# Altium schematic symbol library altera-stratix-iv.SCHLIB: 38 symbols (part 15 of 21) (continued)
## EP4SGX290KF43 (continued)

## EP4SGX360FF35
designator IC?, comment EP4SGX360FF35   Auto generated by make-symbol-device-package-bsdl.ulp Rev. 29 Source: EP4SGX360FF35.bsd
MPN: EP4SGX360FF35C3N
footprint FBGA1152
pins: A2 IOA2, A3 IOA3, A4 IOA4, A5 IOA5, A6 IOA6, A7 IOA7, A8 IOA8, A9 IOA9, A10 IOA10, A11 IOA11, A12 IOA12, A13 IOA13, A14 IOA14, A15 IOA15, A16 IOA16, A17 IOA17, A18 IOA18, A19 IOA19, A20 IOA20, A21 IOA21, A22 IOA22, A23 IOA23, A24 IOA24, A25 IOA25, A26 IOA26, A27 IOA27, A28 IOA28, A29 IOA29, A30 IOA30, A31 IOA31, A32 IOA32, A33 IOA33, AA1 GXB_RX_R5N, AA2 GXB_RX_R5P, AA3 GND@224 (power), AA4 GND@223 (power), AA5 VCC@169 (power), AA6 GND@222 (power), AA7 VCC@156 (power), AA8 GND@221 (power), AA9 VCC@162 (power), AA10 IOAA10, AA11 IOAA11, AA12 IOAA12, AA13 VCC@77 (power), AA14 GND@40 (power), AA15 VCC@78 (power), AA16 GND@41 (power), AA17 VCC@79 (power), AA18 GND@42 (power), AA19 VCC@80 (power), AA20 GND@43 (power), AA21 VCC@81 (power), AA22 GND@44 (power), AA23 IOAA23, AA24 GND@45 (power), AA25 IOAA25, AA26 VCC@159 (power), AA27 GND@165 (power), AA28 VCC@154 (power), AA29 GND@164 (power), AA30 VCC@167 (power), AA31 GND@163 (power), AA32 GND@162 (power), AA33 GXB_RX_L5P, AA34 GXB_RX_L5N, AB1 GND@228 (power), AB2 GND@227 (power), AB3 GXB_TX_R5N, AB4 GXB_TX_R5P, AB5 GND@226 (power), AB6 VCC@172 (power), AB7 GND@225 (power), AB8 VCC@184 (power), AB9 VCC@185 (power), AB10 IOAB10, AB11 IOAB11, AB12 IOAB12, AB13 GND@35 (power), AB14 VCC@72 (power), AB15 GND@36 (power), AB16 VCC@73 (power), AB17 GND@37 (power), AB18 VCC@74 (power), AB19 GND@38 (power), AB20 VCC@75 (power), AB21 GND@39 (power), AB22 VCC@76 (power), AB23 IOAB23, AB24 IOAB24, AB25 IOAB25, AB26 VCC@180 (power), AB27 VCC@181 (power), AB28 GND@169 (power), AB29 VCC@171 (power), AB30 GND@168 (power), AB31 GXB_TX_L5P, AB32 GXB_TX_L5N, AB33 GND@167 (power), AB34 GND@166 (power), AC1 GXB_RX_R4N, AC2 GXB_RX_R4P, AC3 GND@230 (power), AC4 GND@229 (power), AC5 GXB_CMURX_R3N, AC6 GXB_CMURX_R3P, AC7 NC21, AC8 GND@1 (power), AC9 GND@33 (power), AC10 IOAC10, AC11 GND@34 (power), AC12 IOAC12, AC13 VCC@128 (power), AC14 IOAC14, AC15 VCC@127 (power), AC16 IOAC16, AC17 VCC@126 (power), AC18 IOAC18, AC19 VCC@125 (power), AC20 IOAC20, AC21 VCC@124 (power), AC22 IOAC22, AC23 VCC@123 (power), AC24 IOAC24, AC25 IOAC25, AC26 IOAC26, AC27 NCONFIG, AC28 NC22, AC29 GXB_CMURX_L3P, AC30 GXB_CMURX_L3N, AC31 GND@171 (power), AC32 GND@170 (power), AC33 GXB_RX_L4P, AC34 GXB_RX_L4N, AD1 GND@234 (power), AD2 GND@233 (power), AD3 GXB_TX_R4N, AD4 GXB_TX_R4P, AD5 GND@232 (power), AD6 GND@231 (power), AD7 NC19, AD8 NCSO, AD9 IOAD9, AD10 VCC@148 (power), AD11 IOAD11, AD12 GND@27 (power), AD13 IOAD13, AD14 IOAD14, AD15 GND@28 (power), AD16 IOAD16, AD17 IOAD17, AD18 GND@29 (power), AD19 IOAD19, AD20 IOAD20, AD21 GND@30 (power), AD22 IOAD22, AD23 IOAD23, AD24 GND@31 (power), AD25 VCC@147 (power), AD26 IOAD26, AD27 GND@32 (power), AD28 NC20, AD29 GND@175 (power), AD30 GND@174 (power), AD31 GXB_TX_L4P, AD32 GXB_TX_L4N, AD33 GND@173 (power), AD34 GND@172 (power), AE1 GXB_RX_R3N, AE2 GXB_RX_R3P, AE3 GND@236 (power), AE4 GND@235 (power), AE5 GXB_CMURX_R2N, AE6 GXB_CMURX_R2P, AE7 NC17, AE8 NCEO, AE9 IOAE9, AE10 IOAE10, AE11 IOAE11, AE12 IOAE12, AE13 IOAE13, AE14 IOAE14, AE15 IOAE15, AE16 IOAE16, AE17 VCC@8 (power), AE18 IOAE18, AE19 IOAE19, AE20 IOAE20, AE21 IOAE21, AE22 IOAE22, AE23 VCC@29 (power), AE24 IOAE24, AE25 IOAE25, AE26 IOAE26, AE27 IOAE27, AE28 NC18, AE29 GXB_CMURX_L2P, AE30 GXB_CMURX_L2N, AE31 GND@177 (power), AE32 GND@176 (power), AE33 GXB_RX_L3P, AE34 GXB_RX_L3N, AF1 GND@240 (power), AF2 GND@239 (power), AF3 GXB_TX_R3N, AF4 GXB_TX_R3P, AF5 GND@238 (power), AF6 GND@237 (power), AF7 NC15, AF8 GND@26 (power), AF9 VCC@42 (power), AF11 VCC@43 (power), AF12 IOAF12, AF14 IOAF14, AF16 IOAF16, AF17 VCC@141 (power), AF18 VCC@3 (power), AF19 IOAF19, AF21 IOAF21, AF23 IOAF23, AF24 IOAF24, AF25 VCC@28 (power), AF27 VCC@140 (power), AF28 NC16, AF29 GND@181 (power), AF30 GND@180 (power), AF31 GXB_TX_L3P, AF32 GXB_TX_L3N, AF33 GND@179 (power), AF34 GND@178 (power), AG1 GXB_RX_R2N, AG2 GXB_RX_R2P, AG3 GND@242 (power), AG4 GND@241 (power), AG5 GXB_CMURX_R1N, AG6 GXB_CMURX_R1P, AG7 NC13, AG8 VCC@142 (power), AG9 GND@19 (power), AG10 IOAG10, AG11 IOAG11, AG12 GND@20 (power), AG13 IOAG13, AG14 IOAG14, AG15 GND@21 (power), AG16 IOAG16, AG17 VCC@6 (power), AG18 GND@22 (power), AG19 IOAG19, AG20 IOAG20, AG21 GND@23 (power), AG22 IOAG22, AG23 IOAG23, AG24 GND@24 (power), AG25 IOAG25, AG26 IOAG26, AG27 GND@25 (power), AG28 NC14, AG29 GXB_CMURX_L1P, AG30 GXB_CMURX_L1N, AG31 GND@201 (power), AG32 GND@182 (power), AG33 GXB_RX_L2P, AG34 GXB_RX_L2N, AH1 GND@246 (power), AH2 GND@245 (power), AH3 GXB_TX_R2N, AH4 GXB_TX_R2P, AH5 GND@244 (power), AH6 GND@243 (power), AH7 NC11, AH8 IOAH8, AH9 IOAH9, AH10 VCC@41 (power), AH11 IOAH11, AH12 IOAH12, AH13 IOAH13, AH14 VCC@37 (power), AH15 IOAH15, AH16 IOAH16, AH17 VCC@7 (power), AH18 VCC@5 (power), AH19 IOAH19, AH20 VCC@34 (power), AH21 IOAH21, AH22 IOAH22, AH23 IOAH23, AH24 IOAH24, AH25 IOAH25, AH26 IOAH26, AH27 IOAH27, AH28 NC12, AH29 GND@197 (power), AH30 GND@198 (power), AH31 GXB_TX_L2P, AH32 GXB_TX_L2N, AH33 GND@199 (power), AH34 GND@200 (power), AJ1 GXB_RX_R1N, AJ2 GXB_RX_R1P, AJ3 GND@248 (power), AJ4 GND@247 (power), AJ5 GXB_CMURX_R0N, AJ6 GXB_CMURX_R0P, AJ7 NC9, AJ8 IOAJ8, AJ9 IOAJ9, AJ10 IOAJ10, AJ11 IOAJ11, AJ12 IOAJ12, AJ13 IOAJ13, AJ14 IOAJ14, AJ15 IOAJ15, AJ16 IOAJ16, AJ17 VCC@36 (power), AJ18 VCC@4 (power), AJ19 IOAJ19, AJ20 IOAJ20, AJ21 IOAJ21, AJ22 IOAJ22, AJ23 VCC@31 (power), AJ24 IOAJ24, AJ25 IOAJ25, AJ26 VCC@27 (power), AJ27 IOAJ27, AJ28 NC10, AJ29 GXB_CMURX_L0P, AJ30 GXB_CMURX_L0N, AJ31 GND@195 (power), AJ32 GND@196 (power), AJ33 GXB_RX_L1P, AJ34 GXB_RX_L1N, AK1 GND@252 (power), AK2 GND@251 (power), AK3 GXB_TX_R1N, AK4 GXB_TX_R1P, AK5 GND@250 (power), AK6 GND@249 (power), AK7 NC3, AK8 IOAK8, AK9 GND@12 (power), AK10 IOAK10, AK11 IOAK11, AK12 GND@13 (power), AK13 IOAK13, AK14 IOAK14, AK15 GND@14 (power), AK16 IOAK16, AK17 IOAK17, AK18 GND@15 (power), AK19 IOAK19, AK20 IOAK20, AK21 GND@16 (power), AK22 IOAK22, AK23 IOAK23, AK24 GND@17 (power), AK25 IOAK25, AK26 IOAK26, AK27 GND@18 (power), AK28 NC2, AK29 GND@191 (power), AK30 GND@192 (power), AK31 GXB_TX_L1P, AK32 GXB_TX_L1N, AK33 GND@193 (power), AK34 GND@194 (power), AL1 GXB_RX_R0N, AL2 GXB_RX_R0P, AL3 GND@254 (power), AL4 GND@253 (power), AL5 NC7, AL6 NC8, AL7 IOAL7, AL8 IOAL8, AL9 IOAL9, AL10 VCC@38 (power), AL11 IOAL11, AL12 IOAL12, AL13 VCC@39 (power), AL14 IOAL14, AL15 IOAL15, AL16 IOAL16, AL17 IOAL17, AL18 IOAL18, AL19 IOAL19, AL20 IOAL20, AL21 IOAL21, AL22 VCC@33 (power), AL23 IOAL23, AL24 IOAL24, AL25 VCC@30 (power), AL26 IOAL26, AL27 IOAL27, AL28 PORSEL, AL29 NC5, AL30 NC6, AL31 GND@189 (power), AL32 GND@190 (power), AL33 GXB_RX_L0P, AL34 GXB_RX_L0N, AM1 GND@256 (power), AM2 GND@255 (power), AM3 GXB_TX_R0N, AM4 GXB_TX_R0P, AM5 DCLK, AM6 NIO_PULLUP, AM7 VCC@40 (power), AM8 IOAM8, AM9 IOAM9, AM10 IOAM10, AM11 IOAM11, AM12 IOAM12, AM13 IOAM13, AM14 IOAM14, AM15 IOAM15, AM16 IOAM16, AM17 IOAM17, AM18 IOAM18, AM19 IOAM19, AM20 IOAM20, AM21 IOAM21, AM22 IOAM22, AM23 IOAM23, AM24 IOAM24, AM25 IOAM25, AM26 IOAM26, AM27 IOAM27, AM28 VCC@26 (power), AM29 NCE, AM30 NSTATUS, AM31 GXB_TX_L0P, AM32 GXB_TX_L0N, AM33 GND@187 (power), AM34 GND@188 (power), AN1 RREF_R0, AN2 GND@259 (power), AN3 GND@258 (power), AN4 GND@257 (power), AN5 ASDO, AN6 GND@3 (power), AN7 IOAN7, AN8 IOAN8, AN9 GND@4 (power), AN10 IOAN10, AN11 IOAN11, AN12 GND@5 (power), AN13 IOAN13, AN14 IOAN14, AN15 GND@6 (power), AN16 VCC@35 (power), AN17 IOAN17, AN18 GND@7 (power), AN19 VCC@32 (power), AN20 IOAN20, AN21 GND@8 (power), AN22 IOAN22, AN23 IOAN23, AN24 GND@9 (power), AN25 IOAN25, AN26 IOAN26, AN27 GND@10 (power), AN28 IOAN28, AN29 GND@11 (power), AN30 CONF_DONE, AN31 GND@184 (power), AN32 GND@185 (power), AN33 GND@186 (power), AN34 RREF_L0, AP2 GND@260 (power), AP3 IOAP3, AP4 IOAP4, AP5 IOAP5, AP6 IOAP6, AP7 IOAP7, AP8 IOAP8, AP9 IOAP9, AP10 IOAP10, AP11 IOAP11, AP12 IOAP12, AP13 IOAP13, AP14 IOAP14, AP15 IOAP15, AP16 IOAP16, AP17 IOAP17, AP18 IOAP18, AP19 IOAP19, AP20 IOAP20, AP21 IOAP21, AP22 IOAP22, AP23 IOAP23, AP24 IOAP24, AP25 IOAP25, AP26 IOAP26, AP27 IOAP27, AP28 IOAP28, AP29 IOAP29, AP30 IOAP30, AP31 IOAP31, AP32 IOAP32, AP33 GND@183 (power), B1 IOB1, B2 GND@132 (power), B3 IOB3, B4 IOB4, B5 GND@133 (power), B6 IOB6, B7 IOB7, B8 GND@134 (power), B9 IOB9, B10 IOB10, B11 GND@135 (power), B12 IOB12, B13 IOB13, B14 GND@136 (power), B15 IOB15, B16 IOB16, B17 GND@137 (power), B18 IOB18, B19 VCC@64 (power), B20 GND@138 (power), B21 IOB21, B22 IOB22, B23 GND@139 (power), B24 IOB24, B25 IOB25, B26 GND@140 (power), B27 IOB27, B28 IOB28, B29 GND@141 (power), B30 IOB30, B31 IOB31, B32 GND@142 (power), B33 IOB33, B34 IOB34, C1 IOC1, C2 IOC2, C3 TEMPDIODEN, C4 VCC@55 (power), C5 IOC5, C6 IOC6, C7 VCC@56 (power), C8 IOC8, C9 IOC9, C10 IOC10, C11 IOC11, C12 IOC12, C13 IOC13, C14 IOC14, C15 IOC15, C16 IOC16, C17 IOC17, C18 IOC18, C19 IOC19, C20 IOC20, C21 IOC21, C22 IOC22, C23 IOC23, C24 IOC24, C25 IOC25, C26 IOC26, C27 IOC27, C28 VCC@70 (power), C29 IOC29, C30 IOC30, C31 IOC31, C32 IOC32, C33 GND@131 (power), C34 IOC34, D1 IOD1, D2 IOD2, D3 IOD3, D4 IOD4, D5 TEMPDIODEP, D6 IOD6, D7 IOD7, D8 IOD8, D9 IOD9, D10 VCC@58 (power), D11 IOD11, D12 IOD12, D13 VCC@60 (power), D14 IOD14, D15 IOD15, D16 VCC@61 (power), D17 IOD17, D18 IOD18, D19 IOD19, D20 IOD20, D21 IOD21, D22 VCC@65 (power), D23 IOD23, D24 IOD24, D25 VCC@66 (power), D26 IOD26, D27 IOD27, D28 IOD28, D29 IOD29, D30 IOD30, D31 NC1, D32 IOD32, D33 IOD33, D34 IOD34, E1 IOE1, E2 GND@121 (power), E3 IOE3, E4 IOE4, E5 GND@122 (power), E6 IOE6, E7 IOE7, E8 GND@123 (power), E9 IOE9, E10 IOE10, E11 GND@124 (power), E12 IOE12, E13 IOE13, E14 GND@125 (power), E15 IOE15, E16 IOE16, E17 GND@126 (power), E18 IOE18, E19 IOE19, E20 GND@127 (power), E21 IOE21, E22 IOE22, E23 GND@128 (power), E24 IOE24, E25 IOE25, E26 GND@129 (power), E27 IOE27, E28 IOE28, E29 GND@130 (power), E30 IOE30, E31 IOE31, E32 VCC@21 (power), E33 IOE33, E34 IOE34, F1 IOF1, F2 IOF2, F3 VCC@52 (power), F4 IOF4, F5 IOF5, F6 IOF6, F7 IOF7, F8 IOF8, F9 VCC@54 (power), F10 IOF10, F11 IOF11, F12 VCC@57 (power), F13 IOF13, F14 IOF14, F15 IOF15, F16 IOF16, F17 VCC@12 (power), F18 VCC@63 (power), F19 IOF19, F20 IOF20, F21 IOF21, F22 IOF22, F23 IOF23, F24 IOF24, F25 IOF25, F26 IOF26, F27 IOF27, F28 VCC@69 (power), F29 TCK, F30 GND@119 (power), F31 IOF31, F32 IOF32, F33 GND@120 (power), F34 IOF34, G1 IOG1, G2 IOG2, G3 IOG3, G4 IOG4, G5 VCC@51 (power), G6 VCC@149 (power), G7 NC4, G8 IOG8, G9 IOG9, G10 IOG10, G11 IOG11, G12 IOG12, G13 IOG13, G14 IOG14, G15 VCC@59 (power), G16 IOG16, G17 VCC@13 (power), G18 VCC@15 (power), G19 IOG19, G20 IOG20, G21 VCC@62 (power), G22 IOG22, G23 IOG23, G24 VCC@68 (power), G25 IOG25, G26 IOG26, G27 IOG27, G28 TDI, G29 TDO (out), G30 IOG30, G31 IOG31, G32 IOG32, G33 IOG33, G34 IOG34, H1 IOH1, H2 GND@110 (power), H3 IOH3, H4 IOH4, H5 GND@111 (power), H6 IOH6, H7 IOH7, H8 GND@112 (power), H9 IOH9, H10 IOH10, H11 GND@113 (power), H12 IOH12, H13 IOH13, H14 GND@114 (power), H15 IOH15, H16 IOH16, H17 GND@115 (power), H18 VCC@14 (power), H19 IOH19, H20 GND@116 (power), H21 IOH21, H22 IOH22, H23 GND@117 (power), H24 IOH24, H25 IOH25, H26 GND@118 (power), H27 VCC@137 (power), H28 TMS, H29 IOH29, H30 IOH30, H31 IOH31, H32 VCC@20 (power), H33 IOH33, H34 IOH34, J1 IOJ1, J2 IOJ2, J3 IOJ3, J4 IOJ4, J5 IOJ5, J6 IOJ6, J7 VCC@50 (power), J8 VCC@145 (power), J9 MSEL0, J11 IOJ11, J12 IOJ12, J14 IOJ14, J16 IOJ16, J17 VCC@11 (power), J18 VCC@146 (power), J19 IOJ19, J21 IOJ21, J23 IOJ23, J24 IOJ24, J25 IOJ25, J27 GND@107 (power), J28 IOJ28, J29 IOJ29, J30 GND@108 (power), J31 IOJ31, J32 IOJ32, J33 GND@109 (power), J34 IOJ34, K1 IOK1, K2 IOK2, K3 IOK3, K4 VCC@49 (power), K5 IOK5, K6 IOK6, K7 IOK7, K8 IOK8, K9 MSEL2, K10 VCC@53 (power), K11 IOK11, K12 IOK12, K13 IOK13, K14 IOK14, K15 IOK15, K16 IOK16, K17 IOK17, K18 VCC@16 (power), K19 IOK19, K20 IOK20, K21 IOK21, K22 IOK22, K23 IOK23, K24 IOK24, K25 IOK25, K26 TRST, K27 VCC@19 (power), K28 IOK28, K29 IOK29, K30 IOK30, K31 IOK31, K32 IOK32, K33 IOK33, K34 IOK34, L1 IOL1, L2 GND@99 (power), L3 IOL3, L4 IOL4, L5 GND@100 (power), L6 IOL6, L7 IOL7, L8 GND@101 (power), L9 VCC@48 (power), L10 MSEL1, L11 GND@102 (power), L12 IOL12, L13 IOL13, L14 GND@103 (power), L15 IOL15, L16 IOL16, L17 GND@104 (power), L18 IOL18, L19 IOL19, L20 GND@105 (power), L21 IOL21, L22 IOL22, L23 GND@106 (power), L24 IOL24, L25 VCC@67 (power), L26 IOL26, L27 IOL27, L28 IOL28, L29 IOL29, L30 IOL30, L31 IOL31, L32 VCC@25 (power), L33 IOL33, L34 IOL34, M1 IOM1, M2 IOM2, M3 VCC@47 (power), M4 IOM4, M5 IOM5, M6 IOM6, M7 IOM7, M8 IOM8, M9 IOM9, M11 IOM11, M12 VCC@131 (power), M13 IOM13, M14 VCC@132 (power), M15 IOM15, M16 VCC@133 (power), M17 IOM17, M18 VCC@134 (power), M19 IOM19, M20 VCC@135 (power), M21 IOM21, M22 VCC@136 (power), M23 IOM23, M24 GND@95 (power), M25 IOM25, M27 GND@96 (power), M28 VCC@18 (power), M29 IOM29, M30 GND@97 (power), M31 IOM31, M32 IOM32, M33 GND@98 (power), M34 IOM34, N1 ION1, N2 ION2, N3 ION3, N4 ION4, N5 ION5, N6 ION6, N7 VCC@46 (power), N8 ION8, N9 ION9, N10 ION10, N11 ION11, N12 ION12, N13 VCC@116 (power), N14 GND@90 (power), N15 VCC@117 (power), N16 GND@91 (power), N17 VCC@118 (power), N18 GND@92 (power), N19 VCC@119 (power), N20 GND@93 (power), N21 VCC@120 (power), N22 GND@94 (power), N23 VCC@121 (power), N24 ION24, N25 ION25, N26 ION26, N27 ION27, N28 ION28, N29 ION29, N30 ION30, N31 ION31, N32 ION32, N33 ION33, N34 ION34, P1 CLK10P, P2 GND@81 (power), P3 IOP3, P4 IOP4, P5 GND@82 (power), P6 IOP6, P7 IOP7, P8 GND@83 (power), P9 IOP9, P10 IOP10, P11 GND@84 (power), P12 VCC@130 (power), P13 GND@85 (power), P14 VCC@111 (power), P15 GND@86 (power), P16 VCC@112 (power), P17 GND@87 (power), P18 VCC@113 (power), P19 GND@88 (power), P20 VCC@114 (power), P21 GND@89 (power), P22 VCC@115 (power), P23 IOP23, P24 IOP24, P25 VCC@17 (power), P26 IOP26, P27 IOP27, P28 IOP28, P29 IOP29, P30 VCC@24 (power), P31 IOP31, P32 IOP32, P33 IOP33, P34 CLK1N, R1 CLK10N, R2 IOR2, R3 IOR3, R4 VCC@44 (power), R5 IOR5, R6 IOR6, R7 IOR7, R8 IOR8, R9 VCC@45 (power), R11 IOR11, R12 IOR12, R13 VCC@106 (power), R14 GND@72 (power), R15 VCC@107 (power), R16 GND@73 (power), R17 VCC@108 (power), R18 GND@74 (power), R19 VCC@109 (power), R20 GND@75 (power), R21 VCC@110 (power), R22 GND@76 (power), R23 VCC@122 (power), R24 GND@77 (power), R25 IOR25, R27 GND@78 (power), R28 VCC@23 (power), R29 IOR29, R30 GND@79 (power), R31 IOR31, R32 IOR32, R33 GND@80 (power), R34 CLK1P, T1 GND@204 (power), T2 GND@203 (power), T3 GND@202 (power), T4 IOT4, T5 IOT5, T6 IOT6, T7 IOT7, T8 IOT8, T9 IOT9, T10 IOT10, T11 IOT11, T12 VCC@129 (power), T13 GND@67 (power), T14 VCC@101 (power), T15 GND@68 (power), T16 VCC@102 (power), T17 GND@69 (power), T18 VCC@103 (power), T19 GND@70 (power), T20 VCC@104 (power), T21 GND@71 (power), T22 VCC@105 (power), T23 IOT23, T24 IOT24, T25 IOT25, T26 IOT26, T27 IOT27, T28 IOT28, T29 IOT29, T30 IOT30, T31 IOT31, T32 GND@145 (power), T33 GND@144 (power), T34 GND@143 (power), U1 GXB_RX_R7N, U2 GXB_RX_R7P, U3 GND@208 (power), U4 GND@207 (power), U5 VCC@168 (power), U6 GND@206 (power), U7 VCC@157 (power), U8 GND@205 (power), U9 VCC@187 (power), U10 IOU10, U11 GND@62 (power), U12 IOU12, U13 VCC@97 (power), U14 GND@63 (power), U15 VCC@98 (power), U16 GND@64 (power), U17 VCC@71 (power), U18 GND@2 (power), U19 VCC@99 (power), U20 GND@65 (power), U21 VCC@100 (power), U22 GND@66 (power), U23 IOU23, U24 IOU24, U25 VCC@22 (power), U26 VCC@183 (power), U27 GND@149 (power), U28 VCC@155 (power), U29 GND@148 (power), U30 VCC@166 (power), U31 GND@147 (power), U32 GND@146 (power), U33 GXB_RX_L7P, U34 GXB_RX_L7N, V1 GND@212 (power), V2 GND@211 (power), V3 GXB_TX_R7N, V4 GXB_TX_R7P, V5 GND@210 (power), V6 VCC@152 (power), V7 GND@209 (power), V8 VCC@164 (power), V9 VCC@186 (power), V10 VCC@9 (power), V11 IOV11, V12 IOV12, V13 GND@57 (power), V14 VCC@92 (power), V15 GND@58 (power), V16 VCC@93 (power), V17 DNU, V18 VCC@94 (power), V19 GND@59 (power), V20 VCC@95 (power), V21 GND@60 (power), V22 VCC@96 (power), V23 IOV23, V24 GND@61 (power), V25 IOV25, V26 VCC@182 (power), V27 VCC@160 (power), V28 GND@153 (power), V29 VCC@150 (power), V30 GND@152 (power), V31 GXB_TX_L7P, V32 GXB_TX_L7N, V33 GND@151 (power), V34 GND@150 (power), W1 GXB_RX_R6N, W2 GXB_RX_R6P, W3 GND@216 (power), W4 GND@215 (power), W5 VCC@173 (power), W6 GND@214 (power), W7 VCC@165 (power), W8 GND@213 (power), W9 VCC@177 (power), W10 VCC@10 (power), W11 VCC@143 (power), W12 VCC@144 (power), W13 VCC@87 (power), W14 GND@52 (power), W15 VCC@88 (power), W16 GND@53 (power), W17 VCC@89 (power), W18 GND@54 (power), W19 VCC@90 (power), W20 GND@55 (power), W21 VCC@91 (power), W22 GND@56 (power), W23 IOW23, W24 VCC@2 (power), W25 VCC@1 (power), W26 VCC@174 (power), W27 GND@157 (power), W28 VCC@161 (power), W29 GND@156 (power), W30 VCC@170 (power), W31 GND@155 (power), W32 GND@154 (power), W33 GXB_RX_L6P, W34 GXB_RX_L6N, Y1 GND@220 (power), Y2 GND@219 (power), Y3 GXB_TX_R6N, Y4 GXB_TX_R6P, Y5 GND@218 (power), Y6 VCC@153 (power), Y7 GND@217 (power), Y8 VCC@163 (power), Y9 VCC@179 (power), Y10 VCC@178 (power), Y11 GND@46 (power), Y12 IOY12, Y13 GND@47 (power), Y14 VCC@82 (power), Y15 GND@48 (power), Y16 VCC@83 (power), Y17 GND@49 (power), Y18 VCC@84 (power), Y19 GND@50 (power), Y20 VCC@85 (power), Y21 GND@51 (power), Y22 VCC@86 (power), Y23 VCC@138 (power), Y24 VCC@139 (power), Y25 VCC@176 (power), Y26 VCC@175 (power), Y27 VCC@158 (power), Y28 GND@161 (power), Y29 VCC@151 (power), Y30 GND@160 (power), Y31 GXB_TX_L6P, Y32 GXB_TX_L6N, Y33 GND@159 (power), Y34 GND@158 (power)

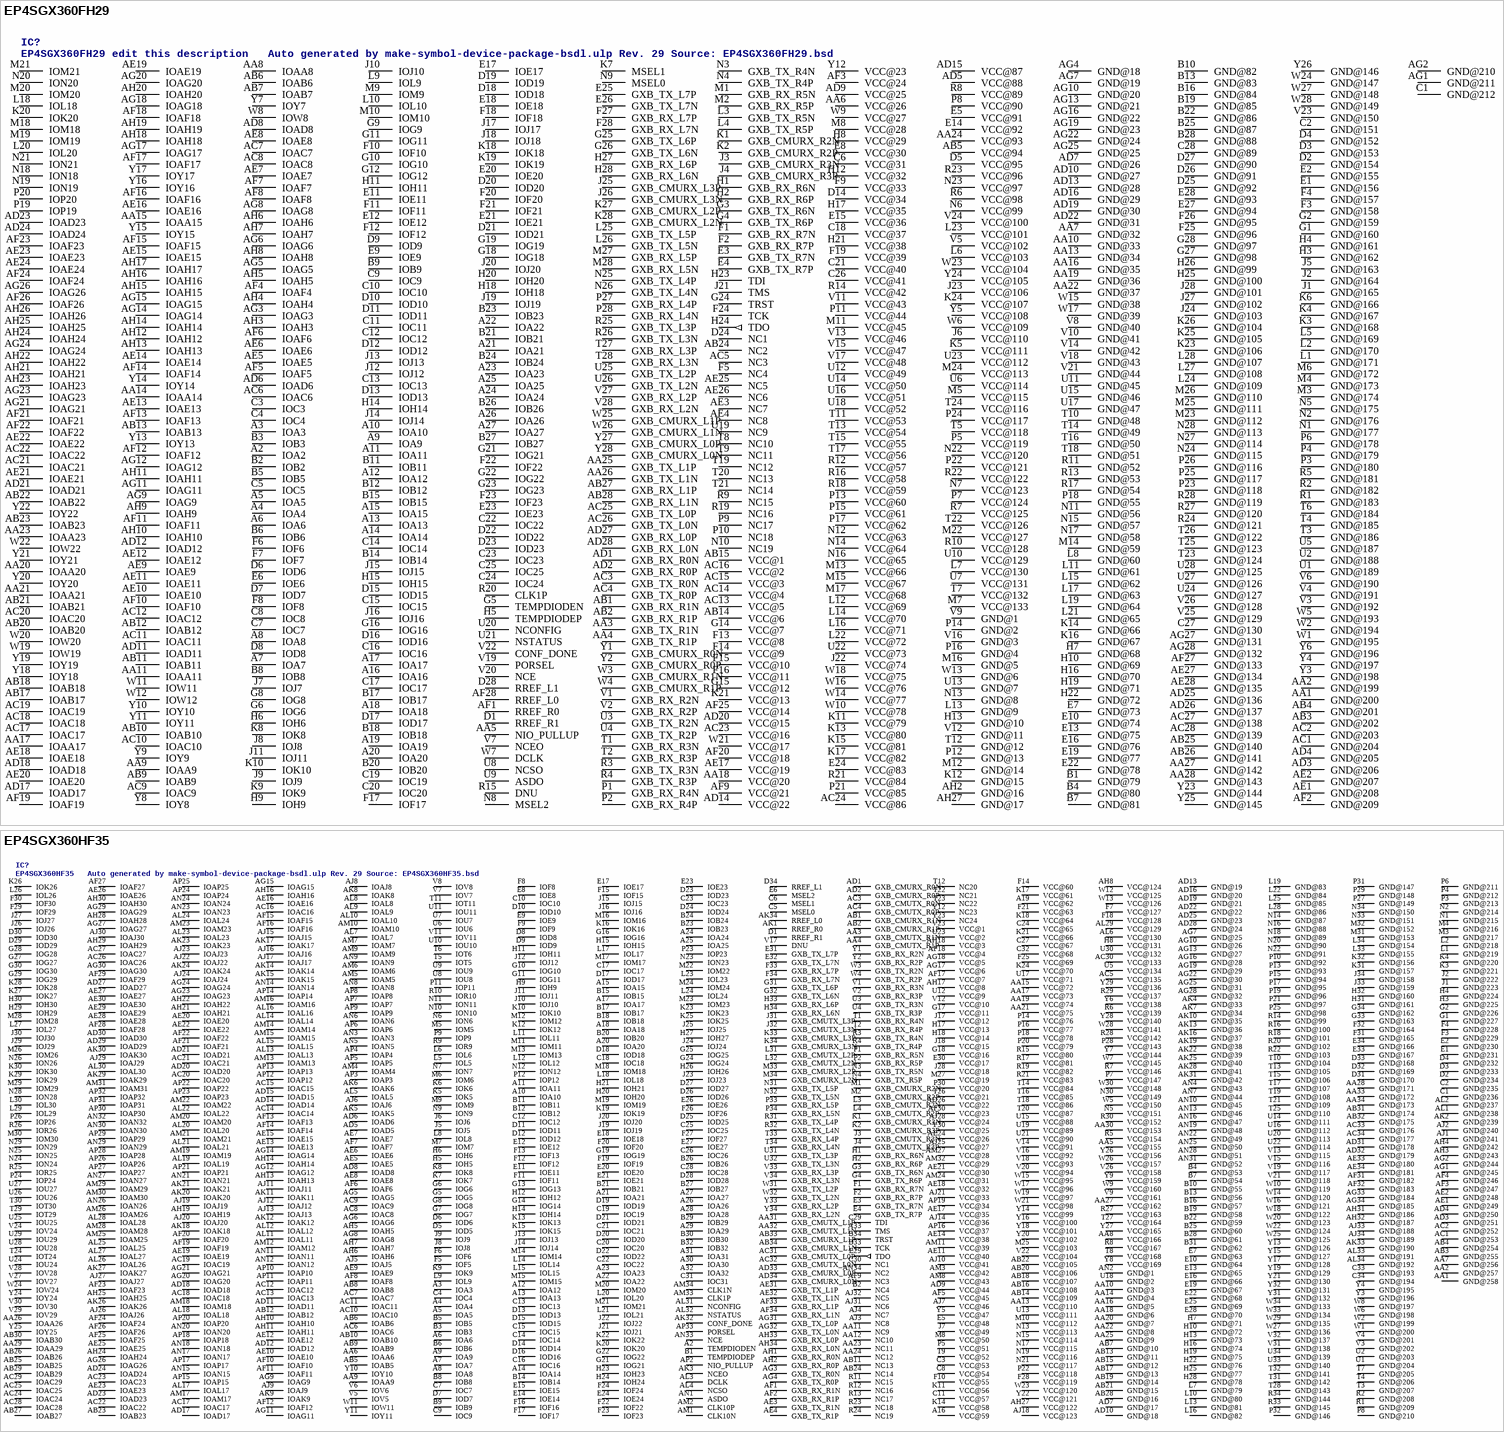
[diagram p14: symbols EP4SGX360FH29 to EP4SGX360HF35]